# Altium schematic symbol library BARKO_SCHLIB.SchLib: 1064 symbols (part 7 of 11) (continued)
## IC-ULN2803ADWR (continued)
TRANS 8NPN DARL 50V 0.5A 18SOIC; Manufacturer: Texas Instruments; Polarity: NPN; Max Collector Current: 500mA; Number of Elements: 8; Collector Emitter Saturation Voltage: 1.1V; .Creator: F:TALI; .PCBCHK: USED; Washability: OK; Supplier 1: Digi-Key; Manufacturer Part Number: ULN2803ADWR; Stock 1: 118267; Pricing 1: 1=1.53, 10=1.366, 100=1.0646, 500=0.87948, 1000=0.69432 (USD); Mount: Surface Mount; Number of Pins: 18; Contact Plating: Gold; Min Operating Temperature: -65°C; Max Operating Temperature: 150°C; Packaging: Tape and Reel; Package Quantity: 1; Collector Emitter Voltage (VCEO): 50V; Collector Emitter Breakdown Voltage: 50V; Number of Drivers: 8; Voltage Rating (DC): 50V; Current Rating: 500mA; Length: 11.62mm; Height: 2.35mm; Width: 7.52mm; Radiation Hardening: No; Lead Free: Lead Free; REACH SVHC: No SVHC; ComponentLink1URL: http://www.ti.com/general/docs/lit/getliterature.tsp?genericPartNumber=ULN2803A&amp;&amp;fileType=pdf; ComponentLink1Description: http://www.ti.com/general/docs/lit/getliterature.tsp?genericPartNumber=ULN2803A&amp;&amp;fileType=pdf; ComponentLink2URL: https://www.verical.com/server-webapp/html/getDatasheet?partID=134747; ComponentLink2Description: https://www.verical.com/server-webapp/html/getDatasheet?partID=134747; ComponentLink3URL: http://www.farnell.com/datasheets/1992213.pdf; ComponentLink3Description: http://www.farnell.com/datasheets/1992213.pdf; ComponentLink4URL: http://www.jameco.com/Jameco/Products/ProdDS/1927351.pdf; ComponentLink4Description: http://www.jameco.com/Jameco/Products/ProdDS/1927351.pdf; ComponentLink5URL: http://www.ti.com/lit/ds/symlink/uln2803a.pdf; ComponentLink5Description: http://www.ti.com/lit/ds/symlink/uln2803a.pdf; ComponentLink6URL: http://www.farnell.com/datasheets/1887697.pdf; ComponentLink6Description: http://www.farnell.com/datasheets/1887697.pdf; ComponentLink7URL: http://www.farnell.com/datasheets/2020638.pdf; ComponentLink7Description: http://www.farnell.com/datasheets/2020638.pdf; Supplier Part Number 1: 296-15777-6-ND; .SCHCHK: USED; Case/Package: SOIC18
footprint SOIC18
pins: 1 IN1, 2 IN2, 3 IN3, 4 IN4, 5 IN5, 6 IN6, 7 IN7, 8 IN8, 9 GND, 10 VCC, 11 OUT8, 12 OUT7, 13 OUT6, 14 OUT5, 15 OUT4, 16 OUT3, 17 OUT2, 18 OUT1

## IC-VN5T006ASPTR-E
designator U?, comment VN5T006ASP
IC DVR HIGH-SIDE 1CH POWERSO-10; Manufacturer: STMicroelectronics; Manufacturer Part Number: VN5T006ASPTR-E; Output Configuration: High Side; Number of Outputs: 1; Nominal Supply Current: 3mA; Interface: On/Off; Fault Protection: Over Voltage,Over Temperature; Supplier 1: Digi-Key; Supplier Part Number 1: 497-14312-1-ND; Stock: 3657; Pricing: 1=5.7, 10=5.117, 25=4.8376, 100=3.9775, 250=3.569 (USD); RoHS: Yes; Mount: Surface Mount; Number of Pins: 10; Min Operating Temperature: -40°C; Max Operating Temperature: 150°C; Packaging: Tape and Reel; Package Quantity: 600; Lead Free: Lead Free; ComponentLink1URL: https://datasheet.ciiva.com/29599/dm00068589-29599933.pdf?src-supplier=Digi-Key; ComponentLink1Description: https://datasheet.ciiva.com/29599/dm00068589-29599933.pdf?src-supplier=Digi-Key; ComponentLink2URL: https://datasheet.ciiva.com/29599/br-car-body-29599934.pdf?src-supplier=Digi-Key; ComponentLink2Description: https://datasheet.ciiva.com/29599/br-car-body-29599934.pdf?src-supplier=Digi-Key; ComponentLink3URL: https://datasheet.ciiva.com/29599/br-car-body-29599935.pdf?src-supplier=Digi-Key; ComponentLink3Description: https://datasheet.ciiva.com/29599/br-car-body-29599935.pdf?src-supplier=Digi-Key
footprint POWERSO10
pins: 1 OUT, 2 OUT, 3 OUT, 4 OUT, 5 OUT, 6 GND, 7 IN, 8 FR_STBY, 9 CS, 10 NC, 11 VCC

## IC-VN5T016AHTR-E
designator U?, comment VN5T016AHT
IC DVR HIGH-SIDE 1CH TO252-6; Manufacturer: STMicroelectronics; Manufacturer Part Number: VN5T016AHTR-E; Fault Protection: Over Voltage,Over Temperature; Interface: On/Off; Max Output Current: 43A; Output Configuration: High Side; Number of Outputs: 1; Supplier 1: Digi-Key; Supplier Part Number 1: 497-14315-1-ND; Stock: 4487; Pricing: 1=3.23, 10=2.904, 25=2.7452, 100=2.257, 250=2.0252, 500=1.952, 1000=1.6226 (USD); RoHS: Yes; Mount: Surface Mount; Case/Package: TO-263-7; Number of Pins: 7; Contact Plating: Tin,Silver; Min Operating Temperature: -40°C; Max Operating Temperature: 150°C; Packaging: Tape and Reel; Package Quantity: 2500; ComponentLink1URL: https://datasheet.ciiva.com/29599/dm00064519-29599872.pdf?src-supplier=Digi-Key; ComponentLink1Description: https://datasheet.ciiva.com/29599/dm00064519-29599872.pdf?src-supplier=Digi-Key
footprint HPAK (D-PAK, 7-Pads, Body 6.40x6.56mm (max), IPC Medium Density)
pins: 1 OUT, 2 GND, 3 IN, 4 VCC, 5 CS, 6 FR_STBY, 7 OUT 

## IC-VN5050AJTR-E
designator U?, comment VN5050A
IC DVR 1CH HISID AUTO POWERSSO12; Manufacturer: STMicroelectronics; Manufacturer Part Number: VN5050AJTR-E; Max Output Current: 18A; Max Supply Voltage: 36V; Min Supply Voltage: 4.5V; Operating Supply Voltage: 13V; Number of Outputs: 1; Nominal Supply Current: 1.5mA; Turn-Off Delay Time: 40000ns; Turn-On Delay Time: 20000ns; On-State Resistance: 50mR; Output Current per Channel: 12A; Max Supply Current: 3mA; Washability: OK; .Creator: M.OZKAN; .PCBCHK: USED; Supplier 1: Digi-Key; Stock 1: 5770; Pricing 1: 1=2.10000, 10=1.88600, 100=1.51580, 500=1.24534, 1000=1.03186 (USD); RoHS: Yes; Mount: Surface Mount; Number of Pins: 12; Min Operating Temperature: -40°C; Max Operating Temperature: 150°C; Packaging: Tape and Reel; Package Quantity: 2500; Number of Drivers: 1; Radiation Hardening: No; Lead Free: Lead Free; ComponentLink1URL: https://datasheet.ciiva.com/4897/cd00151378-114292-4897872.pdf?src-supplier=Mouser; ComponentLink1Description: https://datasheet.ciiva.com/4897/cd00151378-114292-4897872.pdf?src-supplier=Mouser; ComponentLink2URL: https://datasheet.ciiva.com/41458/001184559-da-01-en-ic-dvr-1ch-vn5050ajtr-e-powersso-12-stm-41458244.pdf?src-supplier=Conrad; ComponentLink2Description: https://datasheet.ciiva.com/41458/001184559-da-01-en-ic-dvr-1ch-vn5050ajtr-e-powersso-12-stm-41458244.pdf?src-supplier=Conrad; ComponentLink3URL: https://datasheet.ciiva.com/1955/cd00151378-1955224.pdf?src-supplier=Digi-Key; ComponentLink3Description: https://datasheet.ciiva.com/1955/cd00151378-1955224.pdf?src-supplier=Digi-Key; ComponentLink4URL: https://datasheet.ciiva.com/1955/cd00151378-1955225.pdf?src-supplier=Digi-Key; ComponentLink4Description: https://datasheet.ciiva.com/1955/cd00151378-1955225.pdf?src-supplier=Digi-Key; ComponentLink5URL: https://datasheet.ciiva.com/1955/cd00151378-1955226.pdf?src-supplier=Digi-Key; ComponentLink5Description: https://datasheet.ciiva.com/1955/cd00151378-1955226.pdf?src-supplier=Digi-Key; ComponentLink6URL: https://datasheet.ciiva.com/26810/getdatasheetpartid-365874-26810746.pdf?src-supplier=Verical; ComponentLink6Description: https://datasheet.ciiva.com/26810/getdatasheetpartid-365874-26810746.pdf?src-supplier=Verical; Supplier Part Number 1: 497-11676-1-ND; .SCHCHK: USED
footprint PowerSSO-12_M (SOP, 10-Leads, Body 7.5x9.4mm, Pitch 1.27mm, Thermal Pad, IPC Low Density)
pins: 1 NC1, 2 GND, 3 INPUT, 4 CS, 5 CS_DIS, 6 NC2, 7 NC3, 8 OUT1, 9 OUT2, 10 OUT3, 11 OUT4, 12 NC4, TAB VCC

## IC-VND5T016ASPTR-E
designator U?, comment VND5T016ASP
IC PWR DRIVER N-CHAN 1:1 PWRSO16; Manufacturer: STMicroelectronics; Manufacturer Part Number: VND5T016ASPTR-E; Min Supply Voltage: 8V; Number of Outputs: 2; Fault Protection: Over Voltage,Over Temperature; Operating Supply Voltage: 24V; Operating Supply Current: 4.5mA; Turn-Off Delay Time: 45us; Turn-On Delay Time: 50us; Interface: On/Off; Max Supply Current: 6.5mA; Output Configuration: High Side; Max Output Current: 45A; Max Supply Voltage: 36V; Supplier 1: Digi-Key; Supplier Part Number 1: 497-13079-1-ND; Stock: 591; Pricing: 1=5.29, 10=4.748, 25=4.4888, 100=3.6908, 250=3.3117 (USD); RoHS: Yes; Mount: Surface Mount; Number of Pins: 16; Min Operating Temperature: -40°C; Max Operating Temperature: 150°C; Packaging: Tape and Reel; Package Quantity: 600; Number of Drivers: 2; Lead Free: Lead Free; ComponentLink1URL: https://datasheet.ciiva.com/16510/vnd5t016asp-e-16510851.pdf?src-supplier=Future+Electronics; ComponentLink1Description: https://datasheet.ciiva.com/16510/vnd5t016asp-e-16510851.pdf?src-supplier=Future+Electronics; ComponentLink2URL: https://datasheet.ciiva.com/12073/dm00046672-101255-12073525.pdf?src-supplier=Mouser; ComponentLink2Description: https://datasheet.ciiva.com/12073/dm00046672-101255-12073525.pdf?src-supplier=Mouser; ComponentLink3URL: https://datasheet.ciiva.com/41458/001184796-da-01-en-ic-driver-vnd5t016asptr-e-powerso-16-stm-41458154.pdf?src-supplier=Conrad; ComponentLink3Description: https://datasheet.ciiva.com/41458/001184796-da-01-en-ic-driver-vnd5t016asptr-e-powerso-16-stm-41458154.pdf?src-supplier=Conrad; ComponentLink4URL: https://datasheet.ciiva.com/6603/dm00046672-6603110.pdf?src-supplier=Digi-Key; ComponentLink4Description: https://datasheet.ciiva.com/6603/dm00046672-6603110.pdf?src-supplier=Digi-Key; ComponentLink5URL: https://datasheet.ciiva.com/6603/dm00046672-6603111.pdf?src-supplier=Digi-Key; ComponentLink5Description: https://datasheet.ciiva.com/6603/dm00046672-6603111.pdf?src-supplier=Digi-Key; ComponentLink6URL: https://datasheet.ciiva.com/6603/dm00046672-6603112.pdf?src-supplier=Digi-Key; ComponentLink6Description: https://datasheet.ciiva.com/6603/dm00046672-6603112.pdf?src-supplier=Digi-Key
footprint POWERSO16 (SOP, 16-Leads, Body 7.50x9.45mm, Pitch 0.80mm, Thermal Pad 9.60x7.50mm, IPC Medium Density)
pins: 1 OUT1_1 (in), 2 OUT1_2 (in), 3 OUT1_3 (in), 4 OUT1_4 (in), 5 OUT2_1 (in), 6 OUT2_2 (in), 7 OUT2_3 (in), 8 OUT2_4 (in), 9 IN1 (in), 10 CS1 (in), 11 NC1 (in), 12 FR_STBY (in), 13 GND (in), 14 NC2 (in), 15 CS2 (in), 16 IN2 (in), 17 VCC_TAB

## IC-VND5T100LAJTR-E
designator U?, comment VND5T100LAJ
IC PWR DRVR N-CHAN 1:1 PWRSSO12; Manufacturer: STMicroelectronics; Manufacturer Part Number: VND5T100LAJTR-E; Fault Protection: Over Temperature; Number of Outputs: 2; Max Supply Voltage: 36V; Min Supply Voltage: 8V; Interface: On/Off; Max Output Current: 16A; Turn-On Delay Time: 27000ns; Turn-Off Delay Time: 38000ns; Max Supply Current: 6mA; Output Configuration: High Side; Supplier 1: Digi-Key; Supplier Part Number 1: 497-14314-1-ND; Stock: 4669; Pricing: 1=2.65, 10=2.38, 25=2.25, 100=1.85, 250=1.66, 500=1.6, 1000=1.33 (USD); RoHS: Yes; Mount: Surface Mount; Number of Pins: 12; Min Operating Temperature: -40°C; Max Operating Temperature: 150°C; Packaging: Tape and Reel; Package Quantity: 2500; Number of Drivers: 2; Radiation Hardening: No; ComponentLink1URL: https://datasheet.ciiva.com/29600/dm00058385-29600064.pdf?src-supplier=Digi-Key; ComponentLink1Description: https://datasheet.ciiva.com/29600/dm00058385-29600064.pdf?src-supplier=Digi-Key
footprint PowerSSO-12_M (SOP, 10-Leads, Body 7.5x9.4mm, Pitch 1.27mm, Thermal Pad, IPC Low Density)
pins: 1 CS1 (in), 2 IN1 (in), 3 FR_STBY (in), 4 GND (in), 5 IN2 (in), 6 CS2 (in), 7 VCC_2 (in), 8 OUT2_2 (in), 9 OUT2_1 (in), 10 OUT1_2 (in), 11 OUT1_1 (in), 12 VCC_1 (in), TAB VCC_TAB

## IC-VNQ690SP-E
designator U?, comment VNQ690SP-E
IC DVR QUAD HIGH SIDE POWERSO10; Manufacturer: STMicroelectronics; Max Output Current: 10A; On-State Resistance: 90mR; Output Current per Channel: 6A; Max Supply Current: 6mA; Power Dissipation: 78W; Number of Outputs: 4; Max Input Voltage: 36V; Min Input Voltage: 5.5V; Supplier 1: Digi-Key; Supplier Part Number 1: 497-19257-ND; Manufacturer Part Number: VNQ690SP-E; Stock: 377; Pricing: 1=4.28, 10=3.846, 25=3.636, 100=2.9896, 250=2.6826, 500=2.5856, 1000=2.1493, 2500=2.0685, 5000=2.0038 (USD); RoHS: Yes; Mount: Surface Mount; Number of Pins: 10; Min Operating Temperature: -40°C; Max Operating Temperature: 150°C; Output Current: 10A; Nominal Supply Current: 6mA; Packaging: Rail/Tube; Package Quantity: 50; Max Power Dissipation: 78W; Operating Supply Voltage: 36V; Radiation Hardening: No; ComponentLink1URL: https://datasheet.ciiva.com/1957/cd00044338-1957014.pdf?src-supplier=Digi-Key; ComponentLink1Description: https://datasheet.ciiva.com/1957/cd00044338-1957014.pdf?src-supplier=Digi-Key; ComponentLink2URL: https://datasheet.ciiva.com/12186/cd00044338-470173-12186541.pdf?src-supplier=Mouser; ComponentLink2Description: https://datasheet.ciiva.com/12186/cd00044338-470173-12186541.pdf?src-supplier=Mouser
pins: 1 OUTPUT1, 2 OUTPUT2, 3 OUTPUT3, 4 OUTPUT4, 5 GND, 6 STATUS, 7 INPUT4, 8 INPUT3, 9 INPUT2, 10 INPUT1, TAB VCC

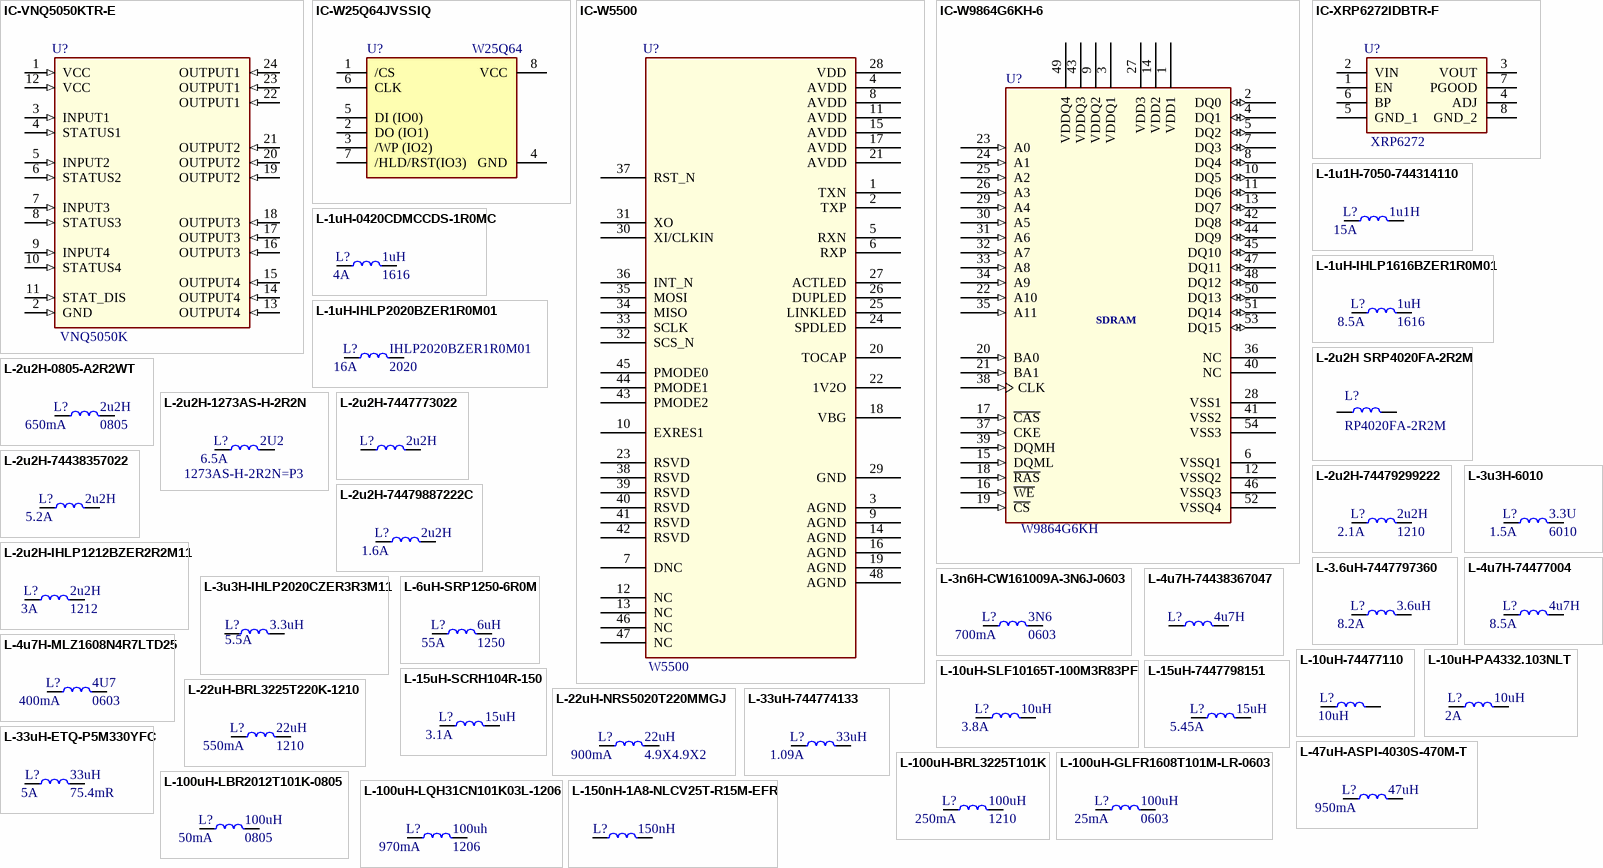
[diagram p31: symbols IC-VNQ5050KTR-E to L-150nH-1A8-NLCV25T-R15M-EFR]

## IC-VNQ5050KTR-E
designator U?, comment VNQ5050K
IC DRIVER HISIDE QUAD POWERSSO24; Manufacturer: STMicroelectronics; Manufacturer Part Number: VNQ5050KTR-E; Interface: On/Off; Number of Drivers: 4; Turn-Off Delay Time: 40000ns; Turn-On Delay Time: 15000ns; Max Supply Current: 14mA; Output Configuration: High Side; Max Output Current: 12A; Max Supply Voltage: 36V; Min Supply Voltage: 4.5V; Operating Supply Voltage: 13V; Fault Protection: Over Voltage,Over Temperature; Supplier 1: Digi-Key; Supplier Part Number 1: 497-11716-1-ND; Stock: 15624; Pricing: 1=4.5, 10=4.042, 25=3.8216, 100=3.1422, 250=2.8195, 500=2.7176 (USD); RoHS: Yes; Mount: Surface Mount; Number of Pins: 24; Min Operating Temperature: -40°C; Max Operating Temperature: 150°C; Packaging: Tape and Reel; Number of Outputs: 4; Output Current: 12A; Nominal Supply Current: 14mA; Package Quantity: 1000; Radiation Hardening: No; Lead Free: Lead Free; ComponentLink1URL: https://datasheet.ciiva.com/15109/getdatasheetpartid-98655-15109902.pdf?src-supplier=Verical; ComponentLink1Description: https://datasheet.ciiva.com/15109/getdatasheetpartid-98655-15109902.pdf?src-supplier=Verical; ComponentLink2URL: https://datasheet.ciiva.com/1955/cd00044249-1955296.pdf?src-supplier=Digi-Key; ComponentLink2Description: https://datasheet.ciiva.com/1955/cd00044249-1955296.pdf?src-supplier=Digi-Key; ComponentLink3URL: https://datasheet.ciiva.com/1955/cd00044249-1955297.pdf?src-supplier=Digi-Key; ComponentLink3Description: https://datasheet.ciiva.com/1955/cd00044249-1955297.pdf?src-supplier=Digi-Key; ComponentLink4URL: https://datasheet.ciiva.com/1955/cd00044249-1955298.pdf?src-supplier=Digi-Key; ComponentLink4Description: https://datasheet.ciiva.com/1955/cd00044249-1955298.pdf?src-supplier=Digi-Key; ComponentLink5URL: https://datasheet.ciiva.com/48511/cd00044249-48511581.pdf?src-supplier=Avnet; ComponentLink5Description: https://datasheet.ciiva.com/48511/cd00044249-48511581.pdf?src-supplier=Avnet; ComponentLink6URL: https://datasheet.ciiva.com/17236/cd00044249-17236447.pdf?src-supplier=Avnet+Europe; ComponentLink6Description: https://datasheet.ciiva.com/17236/cd00044249-17236447.pdf?src-supplier=Avnet+Europe
footprint POWERSSO24 (SOP, 24-Leads, Body 10.30x7.50mm, Pitch 0.80mm, Thermal Pad 7.10x4.70mm, IPC Medium Density)
pins: 1 VCC (in), 2 GND (in), 3 INPUT1 (in), 4 STATUS1 (in), 5 INPUT2 (in), 6 STATUS2 (in), 7 INPUT3 (in), 8 STATUS3 (in), 9 INPUT4 (in), 10 STATUS4 (in), 11 STAT_DIS (in), 12 VCC (in), 13 OUTPUT4 (in), 14 OUTPUT4 (in), 15 OUTPUT4 (in), 16 OUTPUT3 (in), 17 OUTPUT3 (in), 18 OUTPUT3 (in), 19 OUTPUT2 (in), 20 OUTPUT2 (in), 21 OUTPUT2 (in), 22 OUTPUT1 (in), 23 OUTPUT1 (in), 24 OUTPUT1 (in)

## IC-W25Q64JVSSIQ
designator U?, comment W25Q64
IC FLASH 64M SPI 133MHZ 8SOIC; Manufacturer: Winbond; Manufacturer Part Number: W25Q64JVSSIQ; Frequency: 104MHz; Max Supply Voltage: 3.6V; Min Supply Voltage: 2.7V; Page Size: 256B; Density: 64MB; Operating Supply Voltage: 3V; Address Bus Width: 24b; Access Time: 6ns; Washability: OK; .Creator: M.OZKAN; .PCBCHK: USED; Supplier 1: Digi-Key; Stock 1: 94868; Pricing 1: 1=0.93000, 10=0.84500, 25=0.83400, 90=0.82933, 180=0.74156, 270=0.73515, 540=0.72443, 1080=0.69830, 5040=0.63617 (USD); RoHS: Yes; Mount: Surface Mount; Case/Package: SOIC; Number of Pins: 8; Min Operating Temperature: -40°C; Max Operating Temperature: 85°C; Packaging: Tray; Memory Type: FLASH; Interface: SPI; ComponentLink1URL: http://www.winbond.com/resource-files/w25q64jv%20revj%2003272018%20plus.pdf?src-supplier=Digi-Key; ComponentLink1Description: http://www.winbond.com/resource-files/w25q64jv%20revj%2003272018%20plus.pdf?src-supplier=Digi-Key; ComponentLink2URL: https://www.winbond.com/resource-files/w25q64jv%20spi%20%20%20revc%2006032016%20kms.pdf?src-supplier=Avnet+Asia; ComponentLink2Description: https://www.winbond.com/resource-files/w25q64jv%20spi%20%20%20revc%2006032016%20kms.pdf?src-supplier=Avnet+Asia; Supplier Part Number 1: W25Q64JVSSIQ-ND; .SCHCHK: USED
footprint SOIC8-IPC (SOIC, 8-Leads, Body 5.28x5.28mm, Pitch 1.27mm, IPC Medium Density)
pins: 1 /CS, 2 DO (IO1), 3 /WP (IO2), 4 GND, 5 DI (IO0), 6 CLK, 7 /HLD/RST(IO3), 8 VCC

## IC-W5500
designator U?, comment W5500
IC CTLR 3-1 ETH TCP/IP 48LQFP; Manufacturer: WIZnet; Max Supply Current: 132mA; Max Supply Voltage: 3.63V; Min Supply Voltage: 2.97V; Interface: SPI; Number of Transceivers: 1; Washability: OK; .Creator: M.OZKAN; .PCBCHK: USED; Supplier 1: Digi-Key; Supplier Part Number 1: 1278-1021-ND; Manufacturer Part Number: W5500; Stock 1: 17704; Pricing 1: 1=3.95000, 10=3.54600, 25=3.35240, 100=2.75650, 250=2.47340, 500=2.38400, 1000=1.98170, 2500=1.90720, 5000=1.84760 (USD); RoHS: Yes; Case/Package: LQFP; Number of Pins: 48; Min Operating Temperature: -40°C; Max Operating Temperature: 85°C; Packaging: Tray; Package Quantity: 250; Operating Supply Current: 132mA; Lead Free: Lead Free; ComponentLink1URL: https://datasheet.ciiva.com/29644/w5500-ds-v100e-29644866.pdf?src-supplier=Digi-Key; ComponentLink1Description: https://datasheet.ciiva.com/29644/w5500-ds-v100e-29644866.pdf?src-supplier=Digi-Key; ComponentLink2URL: https://datasheet.ciiva.com/24199/w5500-24199988.pdf?src-supplier=Future+Electronics; ComponentLink2Description: https://datasheet.ciiva.com/24199/w5500-24199988.pdf?src-supplier=Future+Electronics; .SCHCHK: USED
footprint STM-LQFP48_M (QFP, 48-Leads, Body 7x7mm, Pitch 0.5mm, IPC Low Density)
pins: 1 TXN, 2 TXP, 3 AGND, 4 AVDD, 5 RXN, 6 RXP, 7 DNC, 8 AVDD, 9 AGND, 10 EXRES1, 11 AVDD, 12 NC, 13 NC, 14 AGND, 15 AVDD, 16 AGND, 17 AVDD, 18 VBG, 19 AGND, 20 TOCAP, 21 AVDD, 22 1V2O, 23 RSVD, 24 SPDLED, 25 LINKLED, 26 DUPLED, 27 ACTLED, 28 VDD, 29 GND, 30 XI/CLKIN, 31 XO, 32 SCS_N, 33 SCLK, 34 MISO, 35 MOSI, 36 INT_N, 37 RST_N, 38 RSVD, 39 RSVD, 40 RSVD, 41 RSVD, 42 RSVD, 43 PMODE2, 44 PMODE1, 45 PMODE0, 46 NC, 47 NC, 48 AGND

## IC-W9864G6KH-6
designator U?, comment W9864G6KH
IC SDRAM 64MBIT 166MHZ 54TSOP; Manufacturer: Winbond; Manufacturer Part Number: W9864G6KH-6; Interface: Parallel; Memory Type: RAM; Washability: OK; .Creator: M.OZKAN; .PCBCHK: USED; Supplier 1: Digi-Key; Stock 1: 1100; Pricing 1: 1=1.21000, 10=1.10500, 25=1.07560, 50=1.07000, 108=0.95648, 324=0.95361, 540=0.93943, 1080=0.89913, 5076=0.83725 (USD); RoHS: Yes; Case/Package: TSOP; Min Operating Temperature: 0°C; Max Operating Temperature: 70°C; Packaging: Tray; Frequency: 166MHz; ComponentLink1URL: http://www.winbond.com/resource-files/w9864g6kh_a02.pdf?src-supplier=Digi-Key; ComponentLink1Description: http://www.winbond.com/resource-files/w9864g6kh_a02.pdf?src-supplier=Digi-Key; Supplier Part Number 1: W9864G6KH-6-ND; .SCHCHK: USED
footprint TSOP-54 II (TSOP, 54-Leads, Body 22.22x10.16mm, Pitch 0.80mm, IPC Medium Density)
pins: 1 VDD1 (power), 2 DQ0 (io), 3 VDDQ1 (power), 4 DQ1 (io), 5 DQ2 (io), 6 VSSQ1 (power), 7 DQ3 (io), 8 DQ4 (io), 9 VDDQ2 (power), 10 DQ5 (io), 11 DQ6 (io), 12 VSSQ2 (power), 13 DQ7 (io), 14 VDD2 (power), 15 DQML (in), 16 ~{WE} (in), 17 ~{CAS} (in), 18 ~{RAS} (in), 19 ~{CS} (in), 20 BA0 (in), 21 BA1 (in), 22 A10 (in), 23 A0 (in), 24 A1 (in), 25 A2 (in), 26 A3 (in), 27 VDD3 (power), 28 VSS1 (power), 29 A4 (in), 30 A5 (in), 31 A6 (in), 32 A7 (in), 33 A8 (in), 34 A9 (in), 35 A11 (in), 36 NC, 37 CKE (in), 38 CLK (in), 39 DQMH (in), 40 NC, 41 VSS2 (power), 42 DQ8 (io), 43 VDDQ3 (power), 44 DQ9 (io), 45 DQ10 (io), 46 VSSQ3 (power), 47 DQ11 (io), 48 DQ12 (io), 49 VDDQ4 (power), 50 DQ13 (io), 51 DQ14 (io), 52 VSSQ4 (power), 53 DQ15 (io), 54 VSS3 (power)
text: SDRAM

## IC-XRP6272IDBTR-F
designator U?, comment XRP6272
IC REG LINEAR POS ADJ 2A 8HSOICN; Manufacturer: Exar; Manufacturer Part Number: XRP6272IDBTR-F; Polarity: Positive; Quiescent Current: 30uA; Reference Voltage: 700mV; Accuracy: 2%; Output Type: Adjustable,Fixed; Dropout Voltage: 480mV; Output Voltage: 5V; Number of Outputs: 1; Max Input Voltage: 6V; Min Current Limit: 2.2A; Min Input Voltage: 1.8V; Washability: OK; .Creator: M.OZKAN; .PCBCHK: USED; Supplier 1: Digi-Key; Supplier Part Number 1: 1016-1746-1-ND; Stock 1: 15134; Pricing 1: 1=0.93000, 10=0.83400, 25=0.79200, 100=0.60820, 250=0.53748, 500=0.50918, 1000=0.39603 (USD); RoHS: Yes; Mount: Surface Mount; Case/Package: SOIC; Number of Pins: 8; Min Operating Temperature: -40°C; Max Operating Temperature: 85°C; Package Quantity: 1; Packaging: Tape and Reel; Output Current: 2A; Max Output Current: 2A; Number of Regulators: 1; Min Output Voltage: 700mV; Length: 5mm; Height: 1.5mm; Width: 4mm; Radiation Hardening: No; Lead Free: Lead Free; REACH SVHC: Unknown; ComponentLink1URL: https://datasheet.ciiva.com/4887/xrp6272-188953-4887939.pdf?src-supplier=Mouser; ComponentLink1Description: https://datasheet.ciiva.com/4887/xrp6272-188953-4887939.pdf?src-supplier=Mouser; ComponentLink2URL: https://datasheet.ciiva.com/2040/xrp6272-ds-r120-113011-2040855.pdf?src-supplier=Digi-Key; ComponentLink2Description: https://datasheet.ciiva.com/2040/xrp6272-ds-r120-113011-2040855.pdf?src-supplier=Digi-Key; ComponentLink3URL: https://datasheet.ciiva.com/23784/xrp6272-ds-r120-113011-23784008.pdf?src-supplier=Newark; ComponentLink3Description: https://datasheet.ciiva.com/23784/xrp6272-ds-r120-113011-23784008.pdf?src-supplier=Newark; ComponentLink4URL: https://datasheet.ciiva.com/2040/xrp6272-ds-r120-113011-2040856.pdf?src-supplier=Digi-Key; ComponentLink4Description: https://datasheet.ciiva.com/2040/xrp6272-ds-r120-113011-2040856.pdf?src-supplier=Digi-Key; ComponentLink5URL: https://datasheet.ciiva.com/2040/xrp6272-ds-r120-113011-2040857.pdf?src-supplier=Digi-Key; ComponentLink5Description: https://datasheet.ciiva.com/2040/xrp6272-ds-r120-113011-2040857.pdf?src-supplier=Digi-Key; .SCHCHK: USED
footprint SOIC8-EP (SOIC, 8-Leads, Body 5x4mm, Pitch 1.27mm, IPC Low Density)
pins: 1 EN, 2 VIN, 3 VOUT, 4 ADJ, 5 GND_1, 6 BP, 7 PGOOD, 8 GND_2
